# Altium footprint library connector_degson.PcbLib: 59 footprints (part 1 of 4)
Each footprint in its own frame and in the unit in brackets; x right, y up, seen from the top. Pads: shape width x height; smd on the part's side, far side on the other; paste and mask are expansions set on the pad; w line width, h text height; cw(c..) or ccw(c..) is an arc to the next point about the centre after c.
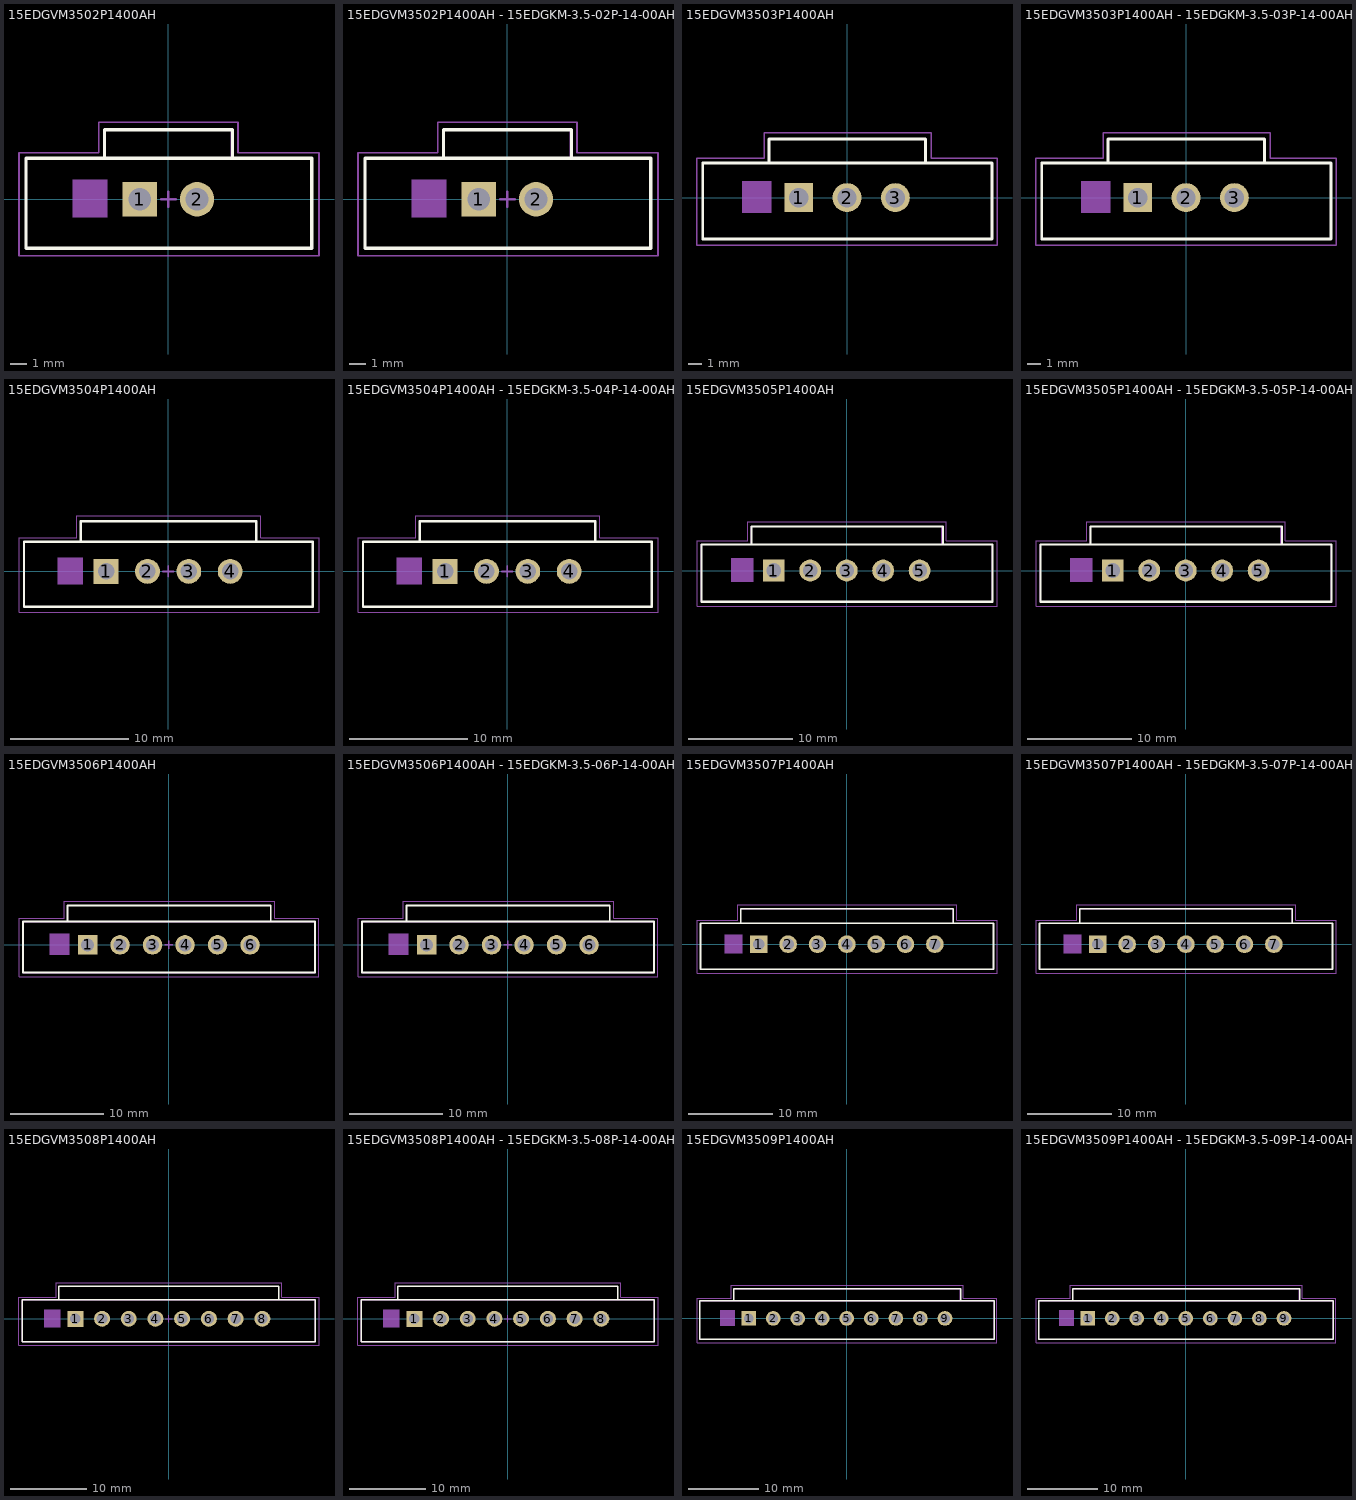
[diagram p0: the footprints below, top view; thin cyan lines are the x and y axes]

## 15EDGVM3502P1400AH [mm] "15EDGVM-3.5-02P-14-00A"
height 3.4
pads (2):
  rect 2.1x2.1 hole 1.4: 1(-1.75,0)
  round 2.1 hole 1.4: 2(1.75,0)
Top Overlay:
  lines w0.2: -3.9,2.5 -3.9,4.24 3.912,4.24 3.912,2.5 ; -8.7,-3 8.75,-3 8.75,2.5 -8.7,2.5 -8.7,-3
Top Designator:
  text ".Designator" at -3.291,5.032 h0.6
Top Assembly:
  rectangle: -5.866,-1.114 -3.708,1.192
  lines w0.1: -3.9,2.5 -3.9,4.24 3.855,4.24 3.855,2.5 ; -8.7,-3 8.75,-3 8.75,2.5 -8.7,2.5 -8.7,-3
Top Courtyard:
  lines w0.1: -9.125,-3.45 9.2,-3.45 9.2,2.85 4.255,2.85 4.255,4.7 -4.25,4.7 -4.25,2.85 -9.125,2.85 -9.125,-3.45
  lines w0.15: -0.45,0 0.45,0 ; 0,-0.45 0,0.45
3D body "15EDGVM-3.5-02P-14-00AH.STEP": height 9.35, standoff -3.3, extent -8.7,-3 8.7,4.2

## 15EDGVM3502P1400AH - 15EDGKM-3.5-02P-14-00AH [mm] "15EDGVM-3.5-02P-14-00A"
height 3.4
pads (2):
  rect 2.1x2.1 hole 1.4: 1(-1.75,0)
  round 2.1 hole 1.4: 2(1.75,0)
Top Overlay:
  lines w0.2: -3.9,2.5 -3.9,4.24 3.912,4.24 3.912,2.5 ; -8.7,-3 -8.7,2.5 8.75,2.5 8.75,-3 -8.7,-3
Top Designator:
  text ".Designator" at -10.849,3.475 h0.6
Top Assembly:
  rectangle: -5.866,-1.114 -3.708,1.192
  lines w0.1: -3.9,2.5 -3.9,4.24 3.855,4.24 3.855,2.5 ; -8.7,-3 -8.7,2.5 8.75,2.5 8.75,-3 -8.7,-3
Top Courtyard:
  lines w0.1: -9.125,-3.45 -9.125,2.85 -4.25,2.85 -4.25,4.7 4.255,4.7 4.255,2.85 9.2,2.85 9.2,-3.45 -9.125,-3.45
  lines w0.15: -0.45,0 0.45,0 ; 0,-0.45 0,0.45
3D body "15EDGVM-3.5-02P-14-00AH.STEP": height 9.35, standoff -3.3, extent -8.6,-3 8.8,4.2
3D body "15EDGKM-3.5-02P-14-00AH.STEP": height 18.6, standoff 3, extent -8.6,-6.5 8.8,4.6

## 15EDGVM3503P1400AH [mm] "15EDGVM-3.5-03P-14-00A"
height 3.4
pads (3):
  rect 2.1x2.1 hole 1.4: 1(-3.5,0)
  round 2.1 hole 1.4: 2(0,0) 3(3.5,0)
Top Overlay:
  lines w0.2: -5.65,2.5 -5.65,4.24 5.688,4.24 5.688,2.5 ; -10.45,-3 -10.45,2.5 10.5,2.5 10.5,-3 -10.45,-3
Top Designator:
  text ".Designator" at -12.599,3.475 h0.6
Top Assembly:
  rectangle: -7.616,-1.114 -5.458,1.192
  lines w0.1: -5.65,2.5 -5.65,4.24 5.688,4.24 5.688,2.5 ; -10.45,-3 -10.45,2.5 10.5,2.5 10.5,-3 -10.45,-3
Top Courtyard:
  lines w0.1: -10.875,-3.45 -10.875,2.85 -6,2.85 -6,4.7 6.09,4.7 6.09,2.85 10.867,2.85 10.867,-3.45 -10.875,-3.45
  lines w0.15: -0.45,0 0.45,0 ; 0,-0.45 0,0.45
3D body "15EDGVM-3.5-03P-14-00AH.STEP": height 9.35, standoff -3.3, extent -10.4,-3 10.5,4.2

## 15EDGVM3503P1400AH - 15EDGKM-3.5-03P-14-00AH [mm] "15EDGVM-3.5-03P-14-00A"
height 3.4
pads (3):
  rect 2.1x2.1 hole 1.4: 1(-3.5,0)
  round 2.1 hole 1.4: 2(0,0) 3(3.5,0)
Top Overlay:
  lines w0.2: -5.65,2.5 -5.65,4.24 5.688,4.24 5.688,2.5 ; -10.45,-3 -10.45,2.5 10.5,2.5 10.5,-3 -10.45,-3
Top Designator:
  text ".Designator" at -12.599,3.475 h0.6
Top Assembly:
  rectangle: -7.616,-1.114 -5.458,1.192
  lines w0.1: -5.65,2.5 -5.65,4.24 5.688,4.24 5.688,2.5 ; -10.45,-3 -10.45,2.5 10.5,2.5 10.5,-3 -10.45,-3
Top Courtyard:
  lines w0.1: -10.875,-3.45 -10.875,2.85 -6,2.85 -6,4.7 6.09,4.7 6.09,2.85 10.867,2.85 10.867,-3.45 -10.875,-3.45
  lines w0.15: -0.45,0 0.45,0 ; 0,-0.45 0,0.45
3D body "15EDGKM-3.5-03P-14-00AH.STEP": height 18.6, standoff 3, extent -10.4,-6.5 10.5,4.6
3D body "15EDGVM-3.5-03P-14-00AH.STEP": height 9.35, standoff -3.3, extent -10.4,-3 10.5,4.2

## 15EDGVM3504P1400AH [mm] "15EDGVM-3.5-04P-14-00A"
height 3.4
pads (4):
  rect 2.1x2.1 hole 1.4: 1(-5.25,0)
  round 2.1 hole 1.4: 2(-1.75,0) 3(1.75,0) 4(5.25,0)
Top Overlay:
  lines w0.2: -7.4,2.5 -7.4,4.24 7.455,4.24 7.455,2.5 ; -12.2,-3 -12.2,2.5 12.25,2.5 12.25,-3 -12.2,-3
Top Designator:
  text ".Designator" at -14.349,3.475 h0.6
Top Assembly:
  rectangle: -9.366,-1.114 -7.208,1.192
  lines w0.1: -7.4,2.5 -7.4,4.24 7.461,4.24 7.461,2.5 ; -12.2,-3 -12.2,2.5 12.25,2.5 12.25,-3 -12.2,-3
Top Courtyard:
  lines w0.1: -12.625,-3.45 -12.625,2.85 -7.75,2.85 -7.75,4.7 7.841,4.7 7.841,2.85 12.771,2.85 12.771,-3.45 -12.625,-3.45
  lines w0.15: -0.45,0 0.45,0 ; 0,-0.45 0,0.45
3D body "15EDGVM-3.5-04P-14-00AH.STEP": height 9.35, standoff -3.3, extent -12.15,-3 12.25,4.2

## 15EDGVM3504P1400AH - 15EDGKM-3.5-04P-14-00AH [mm] "15EDGVM-3.5-04P-14-00A"
height 3.4
pads (4):
  rect 2.1x2.1 hole 1.4: 1(-5.25,0)
  round 2.1 hole 1.4: 2(-1.75,0) 3(1.75,0) 4(5.25,0)
Top Overlay:
  lines w0.2: -7.4,2.5 -7.4,4.24 7.455,4.24 7.455,2.5 ; -12.2,-3 -12.2,2.5 12.25,2.5 12.25,-3 -12.2,-3
Top Designator:
  text ".Designator" at -14.349,3.475 h0.6
Top Assembly:
  rectangle: -9.366,-1.114 -7.208,1.192
  lines w0.1: -7.4,2.5 -7.4,4.24 7.461,4.24 7.461,2.5 ; -12.2,-3 -12.2,2.5 12.25,2.5 12.25,-3 -12.2,-3
Top Courtyard:
  lines w0.1: -12.625,-3.45 -12.625,2.85 -7.75,2.85 -7.75,4.7 7.841,4.7 7.841,2.85 12.771,2.85 12.771,-3.45 -12.625,-3.45
  lines w0.15: -0.45,0 0.45,0 ; 0,-0.45 0,0.45
3D body "15EDGVM-3.5-04P-14-00AH.STEP": height 9.35, standoff -3.3, extent -12.15,-3 12.25,4.2
3D body "15EDGKM-3.5-04P-14-00AH.STEP": height 18.6, standoff 3, extent -12.1,-6.6 12.3,4.5

## 15EDGVM3505P1400AH [mm] "15EDGVM-3.5-05P-14-00A"
height 3.4
pads (5):
  rect 2.1x2.1 hole 1.4: 1(-7,0)
  round 2.1 hole 1.4: 2(-3.5,0) 3(0,0) 4(3.5,0) 5(7,0)
Top Overlay:
  lines w0.2: -9.15,2.5 -9.15,4.24 9.235,4.24 9.235,2.5 ; -13.95,-3 -13.95,2.5 14,2.5 14,-3 -13.95,-3
Top Designator:
  text ".Designator" at -16.099,3.475 h0.6
Top Assembly:
  rectangle: -11.116,-1.114 -8.958,1.192
  lines w0.1: -9.15,2.5 -9.15,4.24 9.148,4.24 9.148,2.5 ; -13.95,-3 -13.95,2.5 14,2.5 14,-3 -13.95,-3
Top Courtyard:
  lines w0.1: -14.375,-3.45 -14.375,2.85 -9.5,2.85 -9.5,4.7 9.581,4.7 9.581,2.85 14.432,2.85 14.432,-3.45 -14.375,-3.45
  lines w0.15: -0.456,-0.015 0.444,-0.015 ; -0.006,-0.465 -0.006,0.435
3D body "15EDGVM-3.5-05P-14-00AH.STEP": height 9.35, standoff -3.3, extent -13.925,-3 13.975,4.2

## 15EDGVM3505P1400AH - 15EDGKM-3.5-05P-14-00AH [mm] "15EDGVM-3.5-05P-14-00A"
height 3.4
pads (5):
  rect 2.1x2.1 hole 1.4: 1(-7,0)
  round 2.1 hole 1.4: 2(-3.5,0) 3(0,0) 4(3.5,0) 5(7,0)
Top Overlay:
  lines w0.2: -9.15,2.5 -9.15,4.24 9.235,4.24 9.235,2.5 ; -13.95,-3 14,-3 14,2.5 -13.95,2.5 -13.95,-3
Top Designator:
  text ".Designator" at -16.099,3.475 h0.6
Top Assembly:
  rectangle: -11.116,-1.114 -8.958,1.192
  lines w0.1: -9.15,2.5 -9.15,4.24 9.148,4.24 9.148,2.5 ; -13.95,-3 14,-3 14,2.5 -13.95,2.5 -13.95,-3
Top Courtyard:
  lines w0.1: -14.375,-3.45 14.432,-3.45 14.432,2.85 9.581,2.85 9.581,4.7 -9.5,4.7 -9.5,2.85 -14.375,2.85 -14.375,-3.45
  lines w0.15: -0.456,-0.015 0.444,-0.015 ; -0.006,-0.465 -0.006,0.435
3D body "15EDGKM-3.5-05P-14-00AH.STEP": height 18.6, standoff 3, extent -13.9,-6.6 14,4.5
3D body "15EDGVM-3.5-05P-14-00AH.STEP": height 9.35, standoff -3.3, extent -13.925,-3 13.975,4.2

## 15EDGVM3506P1400AH [mm] "15EDGVM-3.5-06P-14-00A"
height 3.4
pads (6):
  rect 2.1x2.1 hole 1.4: 1(-8.75,0)
  round 2.1 hole 1.4: 2(-5.25,0) 3(-1.75,0) 4(1.75,0) 5(5.25,0) 6(8.75,0)
Top Overlay:
  lines w0.2: -10.9,2.5 -10.9,4.24 10.98,4.24 10.98,2.5 ; -15.7,-3 15.75,-3 15.75,2.5 -15.7,2.5 -15.7,-3
Top Designator:
  text ".Designator" at -17.849,3.475 h0.6
Top Assembly:
  rectangle: -12.866,-1.114 -10.708,1.192
  lines w0.1: -10.9,2.5 -10.9,4.24 10.971,4.24 10.971,2.5 ; -15.7,-3 15.75,-3 15.75,2.5 -15.7,2.5 -15.7,-3
Top Courtyard:
  lines w0.1: -16.125,-3.45 16.172,-3.45 16.172,2.85 11.43,2.85 11.43,4.7 -11.25,4.7 -11.25,2.85 -16.125,2.85 -16.125,-3.45
  lines w0.15: -0.45,0 0.45,0 ; 0,-0.45 0,0.45
3D body "15EDGVM-3.5-06P-14-00AH.STEP": height 9.35, standoff -3.3, extent -15.65,-3 15.75,4.2

## 15EDGVM3506P1400AH - 15EDGKM-3.5-06P-14-00AH [mm] "15EDGVM-3.5-06P-14-00A"
height 3.4
pads (6):
  rect 2.1x2.1 hole 1.4: 1(-8.75,0)
  round 2.1 hole 1.4: 2(-5.25,0) 3(-1.75,0) 4(1.75,0) 5(5.25,0) 6(8.75,0)
Top Overlay:
  lines w0.2: -10.9,2.5 -10.9,4.24 10.98,4.24 10.98,2.5 ; -15.7,-3 -15.7,2.5 15.75,2.5 15.75,-3 -15.7,-3
Top Designator:
  text ".Designator" at -17.849,3.475 h0.6
Top Assembly:
  rectangle: -12.866,-1.114 -10.708,1.192
  lines w0.1: -10.9,2.5 -10.9,4.24 10.971,4.24 10.971,2.5 ; -15.7,-3 -15.7,2.5 15.75,2.5 15.75,-3 -15.7,-3
Top Courtyard:
  lines w0.1: -16.125,-3.45 -16.125,2.85 -11.25,2.85 -11.25,4.7 11.43,4.7 11.43,2.85 16.172,2.85 16.172,-3.45 -16.125,-3.45
  lines w0.15: -0.45,0 0.45,0 ; 0,-0.45 0,0.45
3D body "15EDGVM-3.5-06P-14-00AH.STEP": height 9.35, standoff -3.3, extent -15.65,-3 15.75,4.2
3D body "15EDGKM-3.5-06P-14-00AH.STEP": height 18.6, standoff 3, extent -15.6,-6.6 15.8,4.5

## 15EDGVM3507P1400AH [mm] "15EDGVM-3.5-07P-14-00A"
height 3.4
pads (7):
  rect 2.1x2.1 hole 1.4: 1(-10.5,0)
  round 2.1 hole 1.4: 2(-7,0) 3(-3.5,0) 4(0,0) 5(3.5,0) 6(7,0) 7(10.5,0)
Top Overlay:
  lines w0.2: -12.65,2.5 -12.65,4.24 12.711,4.24 12.711,2.5 ; -17.45,-3 -17.45,2.5 17.5,2.5 17.5,-3 -17.45,-3
Top Designator:
  text ".Designator" at -19.224,3.45 h0.6
Top Assembly:
  rectangle: -14.616,-1.114 -12.458,1.192
  lines w0.1: -12.65,2.5 -12.65,4.24 12.673,4.24 12.673,2.5 ; -17.45,-3 -17.45,2.5 17.5,2.5 17.5,-3 -17.45,-3
Top Courtyard:
  lines w0.1: -17.875,-3.45 -17.875,2.85 -13,2.85 -13,4.7 13.138,4.7 13.138,2.85 17.917,2.85 17.917,-3.45 -17.875,-3.45
  lines w0.15: -0.45,0 0.45,0 ; 0,-0.45 0,0.45
3D body "15EDGVM-3.5-07P-14-00AH.STEP": height 9.35, standoff -3.3, extent -17.425,-3 17.475,4.2

## 15EDGVM3507P1400AH - 15EDGKM-3.5-07P-14-00AH [mm] "15EDGVM-3.5-07P-14-00A"
height 3.4
pads (7):
  rect 2.1x2.1 hole 1.4: 1(-10.5,0)
  round 2.1 hole 1.4: 2(-7,0) 3(-3.5,0) 4(0,0) 5(3.5,0) 6(7,0) 7(10.5,0)
Top Overlay:
  lines w0.2: -12.65,2.5 -12.65,4.24 12.711,4.24 12.711,2.5 ; -17.45,-3 -17.45,2.5 17.5,2.5 17.5,-3 -17.45,-3
Top Designator:
  text ".Designator" at -19.224,3.45 h0.6
Top Assembly:
  rectangle: -14.616,-1.114 -12.458,1.192
  lines w0.1: -12.65,2.5 -12.65,4.24 12.673,4.24 12.673,2.5 ; -17.45,-3 -17.45,2.5 17.5,2.5 17.5,-3 -17.45,-3
Top Courtyard:
  lines w0.1: -17.875,-3.45 -17.875,2.85 -13,2.85 -13,4.7 13.138,4.7 13.138,2.85 17.917,2.85 17.917,-3.45 -17.875,-3.45
  lines w0.15: -0.45,0 0.45,0 ; 0,-0.45 0,0.45
3D body "15EDGKM-3.5-07P-14-00AH.STEP": height -3.3, standoff -18.9, extent -17.35,-6.5 17.55,4.6
3D body "15EDGVM-3.5-07P-14-00AH.STEP": height 9.35, standoff -3.3, extent -17.425,-3 17.475,4.2

## 15EDGVM3508P1400AH [mm] "15EDGVM-3.5-08P-14-00A"
height 3.4
pads (8):
  rect 2.1x2.1 hole 1.4: 1(-12.25,0)
  round 2.1 hole 1.4: 2(-8.75,0) 3(-5.25,0) 4(-1.75,0) 5(1.75,0) 6(5.25,0) 7(8.75,0) 8(12.25,0)
Top Overlay:
  lines w0.2: -14.4,2.5 -14.4,4.24 14.4,4.24 14.4,2.5 ; -19.2,-3 19.2,-3 19.2,2.5 -19.2,2.5 -19.2,-3
Top Designator:
  text ".Designator" at -21.349,3.475 h0.6
Top Assembly:
  rectangle: -16.366,-1.114 -14.208,1.192
  lines w0.1: -14.4,2.5 -14.4,4.24 14.4,4.24 14.4,2.5 ; -19.2,-3 19.2,-3 19.2,2.5 -19.2,2.5 -19.2,-3
Top Courtyard:
  lines w0.1: -19.625,-3.45 19.675,-3.45 19.675,2.85 14.8,2.85 14.8,4.7 -14.75,4.7 -14.75,2.85 -19.625,2.85 -19.625,-3.45
  lines w0.15: -0.45,0 0.45,0 ; 0,-0.45 0,0.45
3D body "15EDGVM-3.5-08P-14-00AH.STEP": height 9.35, standoff -3.3, extent -19.175,-3.025 19.225,4.175

## 15EDGVM3508P1400AH - 15EDGKM-3.5-08P-14-00AH [mm] "15EDGVM-3.5-08P-14-00A"
height 3.4
pads (8):
  rect 2.1x2.1 hole 1.4: 1(-12.25,0)
  round 2.1 hole 1.4: 2(-8.75,0) 3(-5.25,0) 4(-1.75,0) 5(1.75,0) 6(5.25,0) 7(8.75,0) 8(12.25,0)
Top Overlay:
  lines w0.2: -14.4,2.5 -14.4,4.24 14.4,4.24 14.4,2.5 ; -19.2,-3 -19.2,2.5 19.2,2.5 19.2,-3 -19.2,-3
Top Designator:
  text ".Designator" at -21.349,3.475 h0.6
Top Assembly:
  rectangle: -16.366,-1.114 -14.208,1.192
  lines w0.1: -14.4,2.5 -14.4,4.24 14.4,4.24 14.4,2.5 ; -19.2,-3 -19.2,2.5 19.2,2.5 19.2,-3 -19.2,-3
Top Courtyard:
  lines w0.1: -19.625,-3.45 -19.625,2.85 -14.75,2.85 -14.75,4.7 14.8,4.7 14.8,2.85 19.675,2.85 19.675,-3.45 -19.625,-3.45
  lines w0.15: -0.45,0 0.45,0 ; 0,-0.45 0,0.45
3D body "15EDGVM-3.5-08P-14-00AH.STEP": height 9.35, standoff -3.3, extent -19.175,-3.025 19.225,4.175
3D body "15EDGKM-3.5-08P-14-00AH.STEP": height 18.6, standoff 3, extent -19.2,-6.6 19.2,4.5

## 15EDGVM3509P1400AH [mm] "15EDGVM-3.5-09P-14-00A"
height 3.4
pads (9):
  rect 2.1x2.1 hole 1.4: 1(-14,0)
  round 2.1 hole 1.4: 2(-10.5,0) 3(-7,0) 4(-3.5,0) 5(0,0) 6(3.5,0) 7(7,0) 8(10.5,0) 9(14,0)
Top Overlay:
  lines w0.2: -16.15,2.5 -16.15,4.24 16.247,4.24 16.247,2.5 ; -20.95,-3 21,-3 21,2.5 -20.95,2.5 -20.95,-3
Top Designator:
  text ".Designator" at -23.099,3.475 h0.6
Top Assembly:
  rectangle: -18.116,-1.114 -15.958,1.192
  lines w0.1: -16.15,2.5 -16.15,4.24 16.19,4.24 16.19,2.5 ; -20.95,-3 21,-3 21,2.5 -20.95,2.5 -20.95,-3
Top Courtyard:
  lines w0.1: -21.375,-3.45 21.425,-3.45 21.425,2.85 16.619,2.85 16.619,4.7 -16.5,4.7 -16.5,2.85 -21.375,2.85 -21.375,-3.45
  lines w0.15: -0.45,0 0.45,0 ; 0,-0.45 0,0.45
3D body "15EDGVM-3.5-09P-14-00AH.STEP": height 9.35, standoff -3.3, extent -20.95,-3 20.95,4.2

## 15EDGVM3509P1400AH - 15EDGKM-3.5-09P-14-00AH [mm] "15EDGVM-3.5-09P-14-00A"
height 3.4
pads (9):
  rect 2.1x2.1 hole 1.4: 1(-14,0)
  round 2.1 hole 1.4: 2(-10.5,0) 3(-7,0) 4(-3.5,0) 5(0,0) 6(3.5,0) 7(7,0) 8(10.5,0) 9(14,0)
Top Overlay:
  lines w0.2: -16.15,2.5 -16.15,4.24 16.247,4.24 16.247,2.5 ; -20.95,-3 -20.95,2.5 21,2.5 21,-3 -20.95,-3
Top Designator:
  text ".Designator" at -23.099,3.475 h0.6
Top Assembly:
  rectangle: -18.116,-1.114 -15.958,1.192
  lines w0.1: -16.15,2.5 -16.15,4.24 16.19,4.24 16.19,2.5 ; -20.95,-3 -20.95,2.5 21,2.5 21,-3 -20.95,-3
Top Courtyard:
  lines w0.1: -21.375,-3.45 -21.375,2.85 -16.5,2.85 -16.5,4.7 16.619,4.7 16.619,2.85 21.425,2.85 21.425,-3.45 -21.375,-3.45
  lines w0.15: -0.45,0 0.45,0 ; 0,-0.45 0,0.45
3D body "15EDGKM-3.5-09P-14-00AH.STEP": height 18.6, standoff 3, extent -20.95,-6.6 20.95,4.5
3D body "15EDGVM-3.5-09P-14-00AH.STEP": height 9.35, standoff -3.3, extent -20.95,-3 20.95,4.2